# Altium footprint library rf_components.PcbLib: 8 footprints
Each footprint in its own frame and in the unit in brackets; x right, y up, seen from the top. Pads: shape width x height; smd on the part's side, far side on the other; paste and mask are expansions set on the pad; w line width, h text height; cw(c..) or ccw(c..) is an arc to the next point about the centre after c.
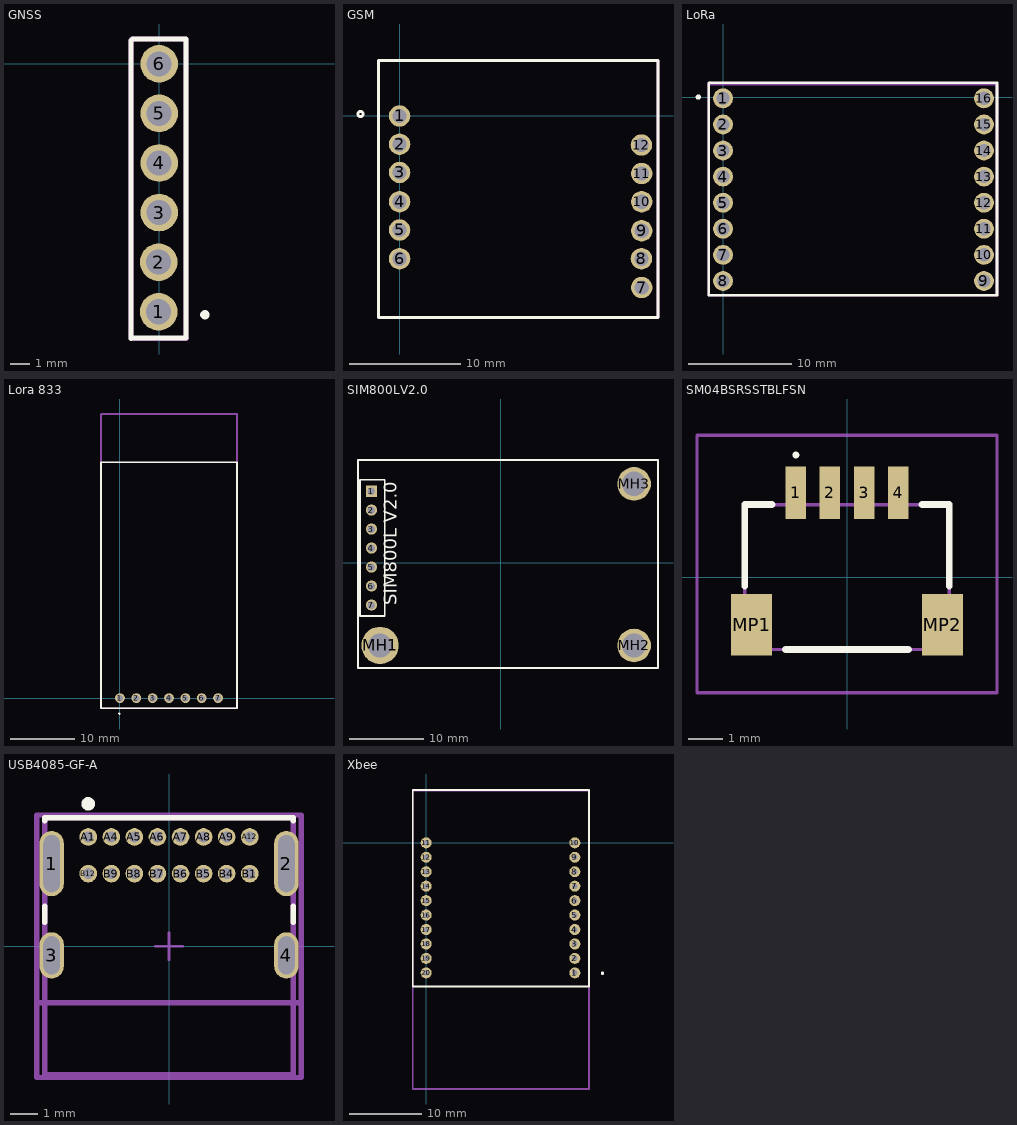
[diagram p0: the footprints below, top view; thin cyan lines are the x and y axes]

## GNSS [mm]
pads (6):
  round 1.935 hole 1.29: 1(-0.025,-12.75) 2(-0.025,-10.2) 3(0,-7.65) 4(0,-5.1) 5(0,-2.55) 6(0,0)
Top Overlay:
  circle w0.254: c2.35,-12.9 r0.112
  lines w0.254: -1.45,1.2 -1.45,-14.125 cw(c-1.425,-14.125) -1.425,-14.1 1.375,-14.1 1.375,1.275 -1.375,1.275
Mechanical 1:
  lines w0.254: 1.4,-14.125 cw(c1.4,-14.1) 1.375,-14.1 ; 1.375,-14.1 1.375,1.275 -1.375,1.275 ccw(c-1.375,1.2) -1.45,1.2 -1.45,-14.125 1.35,-14.125 1.375,-14.1
3D body "PH-1x6.step": height 5.5, standoff -6.1, extent -1.275,-14 1.225,1.2

## GSM [mm]
pads (12):
  round 1.935 hole 1.29: 1(0,0) 2(0,-2.55) 3(0,-5.1) 4(0,-7.75) 5(0,-10.3) 6(0,-12.9) 7(21.875,-15.5) 8(21.85,-12.9) 9(21.875,-10.375) 10(21.875,-7.75) 11(21.875,-5.2) 12(21.85,-2.625)
Top Overlay:
  circle w0.254: c-3.525,0.175 r0.23
  lines w0.254: -1.9,5 23.35,5 23.35,-18.2 -1.875,-18.2 cw(c-1.875,-18.175) -1.9,-18.175 -1.9,4.925 cw(c-1.825,4.925) -1.825,5
Mechanical 1:
  lines w0.254: -1.9,-18.175 ccw(c-1.875,-18.175) -1.875,-18.2 23.35,-18.2 23.35,5 -1.75,5 -1.9,5 -1.9,4.85 -1.9,-18.175
3D body "PH-1x5.step": height 5.5, standoff -6.1, extent -1.25,-14.15 1.25,-1.49
3D body "SIM800L v10.SLDPRT": height 6.78, standoff 1.01, extent -1.729,-18.259 23.288,4.741
3D body "PH-1x6.step": height 5.5, standoff -6.1, extent 20.625,-16.75 23.125,-1.55

## LoRa [mm]
pads (16):
  round 1.935 hole 1.29: 1(0,-0.127) 2(0,-2.667) 3(0,-5.207) 4(0,-7.747) 5(0,-10.287) 6(0,-12.827) 7(0,-15.367) 8(0,-17.907) 9(25.4,-17.907) 10(25.4,-15.367) 11(25.4,-12.827) 12(25.4,-10.287) 13(25.4,-7.747) 14(25.4,-5.207) 15(25.4,-2.667) 16(25.4,-0.127)
Top Overlay:
  circle w0.254: c-2.413,0 r0.127
  lines w0.254: -1.397,-19.304 -1.397,0.762 -1.397,1.27 cw(c-1.27,1.27) -1.27,1.397 26.67,1.397 26.67,0.762 26.67,-19.304 -1.397,-19.304
Mechanical 1:
  lines w0.254: -1.27,1.27 26.479,1.27 cw(c26.479,1.079) 26.67,1.079 26.67,-19.304 -1.397,-19.304 -1.397,1.27 cw(c-1.27,1.27) -1.27,1.397
3D body "lora-ra-02-ai-thinker.STEP": height 6.5, standoff 1.9, extent -1.2,-19.275 26.7,1.125
3D body "PH-1x8.step": height 5.5, standoff -6.1, extent -1.15,-19.165 1.35,1.115
3D body "PH-1x8.step": height 5.5, standoff -6.1, extent 24.175,-19.165 26.675,1.115

## Lora 833 [mil]
pads (7):
  round 60 hole 39.37: 1(0,0) 2(100.39,0) 3(200.79,0) 4(301.18,0) 5(401.57,0) 6(501.97,0) 7(602.36,0)
Top Overlay:
  circle w10: c-3.94,-95.47 r2.2
  lines w10: -116.14,-62.99 718.5,-62.99 718.5,1447.83 -116.14,1447.83 -116.14,-62.99
Mechanical 1:
  lines w10: -116.14,-62.99 -116.14,1744.09 cw(c-115.16,1744.09) -115.16,1745.08 718.5,1745.08 718.5,-62.99 -116.14,-62.99
3D body "E220-900T22D.step": height 352.5, standoff -212.85, extent -113.19,-67.91 713.58,1731.5
3D body "Male Pin Header.step": height 255.91, standoff -177.17, extent 173.23,1180.12 271.65,1278.54
3D body "Male Pin Header.step": height 255.91, standoff -177.17, extent 73.82,1180.12 172.24,1278.54
3D body "Male Pin Header.step": height 255.91, standoff -177.17, extent -26.57,1180.12 71.85,1278.54

## SIM800LV2.0 [mm]
pads (10):
  rect 1.5x1.5 hole 1: 1(-17.325,9.6)
  round 1.5 hole 1: 2(-17.325,7.06) 3(-17.325,4.52) 4(-17.325,1.98) 5(-17.325,-0.56) 6(-17.325,-3.1) 7(-17.325,-5.64)
  round 5 hole 3.25 unplated mask+0.2: MH1(-16.175,-11.05)
  round 4.5 hole 3.25 unplated mask+0.2: MH2(17.825,-11.05) MH3(17.825,10.575)
Top Overlay:
  lines w0.254: -19.125,13.775 21.025,13.775 21.025,-14.075 -19.1,-14.075 -19.1,13.775 ; -16.056,11.125 -16.056,11.125 ; -16.056,11.125 -17.628,11.125 -18.875,11.125 -18.875,-7.125 -15.55,-7.125 -15.55,11.125 -16.056,11.125
  text "SIM800L V2.0" at -13.345,-5.7 h3
3D body "Tornillo plastico negro M3x6mm.SLDPRT": height 6.47, standoff -1.9, extent -18.963,-13.85 -13.387,-8.25
3D body "Tornillo plastico negro M3x6mm.SLDPRT": height 6.47, standoff -1.9, extent 15.037,7.775 20.613,13.375
3D body "Tornillo plastico negro M3x6mm.SLDPRT": height 6.47, standoff -1.9, extent 15.037,-13.85 20.613,-8.25
3D body "SIM800L_EVB-Module.step": height 8.31, standoff -5.45, extent -18.975,-13.935 20.875,13.635

## SM04BSRSSTBLFSN [mm]
pads (6):
  rect 0.6x1.55 smd: 1(-1.5,2.475) 2(-0.5,2.475) 3(0.5,2.475) 4(1.5,2.475)
  rect 1.2x1.8 smd: MP1(-2.8,-1.4) MP2(2.8,-1.4)
Top Overlay:
  lines w0.1: -1.5,3.529 cw(c-1.5,3.579) -1.5,3.629 cw(c-1.5,3.579) -1.5,3.529
  lines w0.2: -3,-0.271 -3,2.125 -2.2,2.125 ; -1.8,-2.125 1.8,-2.125 ; 2.2,2.129 3,2.125 3,-0.271
Mechanical 13:
  lines w0.1: -3,-2.125 -3,2.125 3,2.125 3,-2.125 -3,-2.125
Mechanical 15:
  lines w0.1: -4.4,-3.392 -4.4,4.158 4.4,4.158 4.4,-3.392 -4.4,-3.392
3D body "SM04B-SRSS-TB__LF__SN_.stp": height 2.97, standoff 0.01, extent -3,-2.095 3,2.855

## USB4085-GF-A [mm]
pads (20):
  rrect100% 0.9x2.4 hole 2.1 slot 0.6 at 0 deg paste-2539.97 mask+0: 1(-4.325,3.045) 2(4.325,3.045)
  rrect100% 0.9x1.7 hole 1.4 slot 0.6 at 0 deg paste-2539.97 mask+0: 3(-4.325,-0.335) 4(4.325,-0.335)
  round 0.65 hole 0.4 paste-2539.97 mask+0: A1(-2.975,4.025) A4(-2.125,4.025) A5(-1.275,4.025) A6(-0.425,4.025) A7(0.425,4.025) A8(1.275,4.025) A9(2.125,4.025) A12(2.975,4.025) B1(2.975,2.675) B4(2.125,2.675) B5(1.275,2.675) B6(0.425,2.675) B7(-0.425,2.675) B8(-1.275,2.675) B9(-2.125,2.675) B12(-2.975,2.675)
Top Overlay:
  circle w0.25: c-2.975,5.245 r0.125
  lines w0.2: -4.575,0.89 -4.575,1.47 ; -4.575,4.62 -4.575,4.735 4.575,4.735 4.575,4.62 ; 4.575,0.89 4.575,1.47
Top 3D Body:
  lines w0.2: -4.875,-2.075 4.875,-2.075 ; -4.575,-4.735 -4.575,4.735 4.575,4.735 4.575,-4.735 -4.575,-4.735
Board:
  lines w0.2: -4.875,-4.835 -4.875,4.835 4.875,4.835 4.875,-4.835 -4.875,-4.835
Top Assembly:
  lines w0.2: -4.875,-4.835 -4.875,4.835 4.875,4.835 4.875,-4.835 -4.875,-4.835
  text ".Designator" at 0,0.187 h1
Top Component Center:
  lines w0.1: -0.5,0 0.5,0 ; 0,-0.5 0,0.5
3D body "Conn_GCT_USB4085-GF-A_eec.STEP": height 0.25, standoff 0, extent -4.875,-4.835 4.875,4.835

## Xbee [mil]
pads (20):
  round 60 hole 30: 1(810.04,-708.66) 2(810.04,-629.92) 3(810.04,-551.18) 4(810.04,-472.44) 5(810.04,-393.7) 6(810.04,-314.96) 7(810.04,-236.22) 8(810.04,-157.48) 9(810.04,-78.74) 10(810.04,0) 11(0,0) 12(0,-78.74) 13(0,-157.48) 14(0,-236.22) 15(0,-314.96) 16(0,-393.7) 17(0,-472.44) 18(0,-551.18) 19(0,-629.92) 20(0,-708.66)
Top Overlay:
  circle w10: c960.63,-710.63 r4.18
  lines w10: -72.83,-782.48 887.8,-782.48 887.8,288.39 -67.91,288.39 ccw(c-67.91,283.46) -72.83,283.46 -72.83,-782.48
Mechanical 1:
  lines w10: -67.91,283.46 882.87,283.46 ccw(c882.87,288.39) 887.8,288.39 887.8,-1341.54 -72.83,-1341.54 -72.83,283.46 cw(c-67.91,283.46) -67.91,288.39
3D body "xbees21.SLDPRT": height 322.8, standoff -145.67, extent -68.9,-1337.6 883.86,284.45